# Altium footprint library bs_libs.PcbLib: 95 footprints (part 6 of 6)
Each footprint in its own frame and in the unit in brackets; x right, y up, seen from the top. Pads: shape width x height; smd on the part's side, far side on the other; paste and mask are expansions set on the pad; w line width, h text height; cw(c..) or ccw(c..) is an arc to the next point about the centre after c.
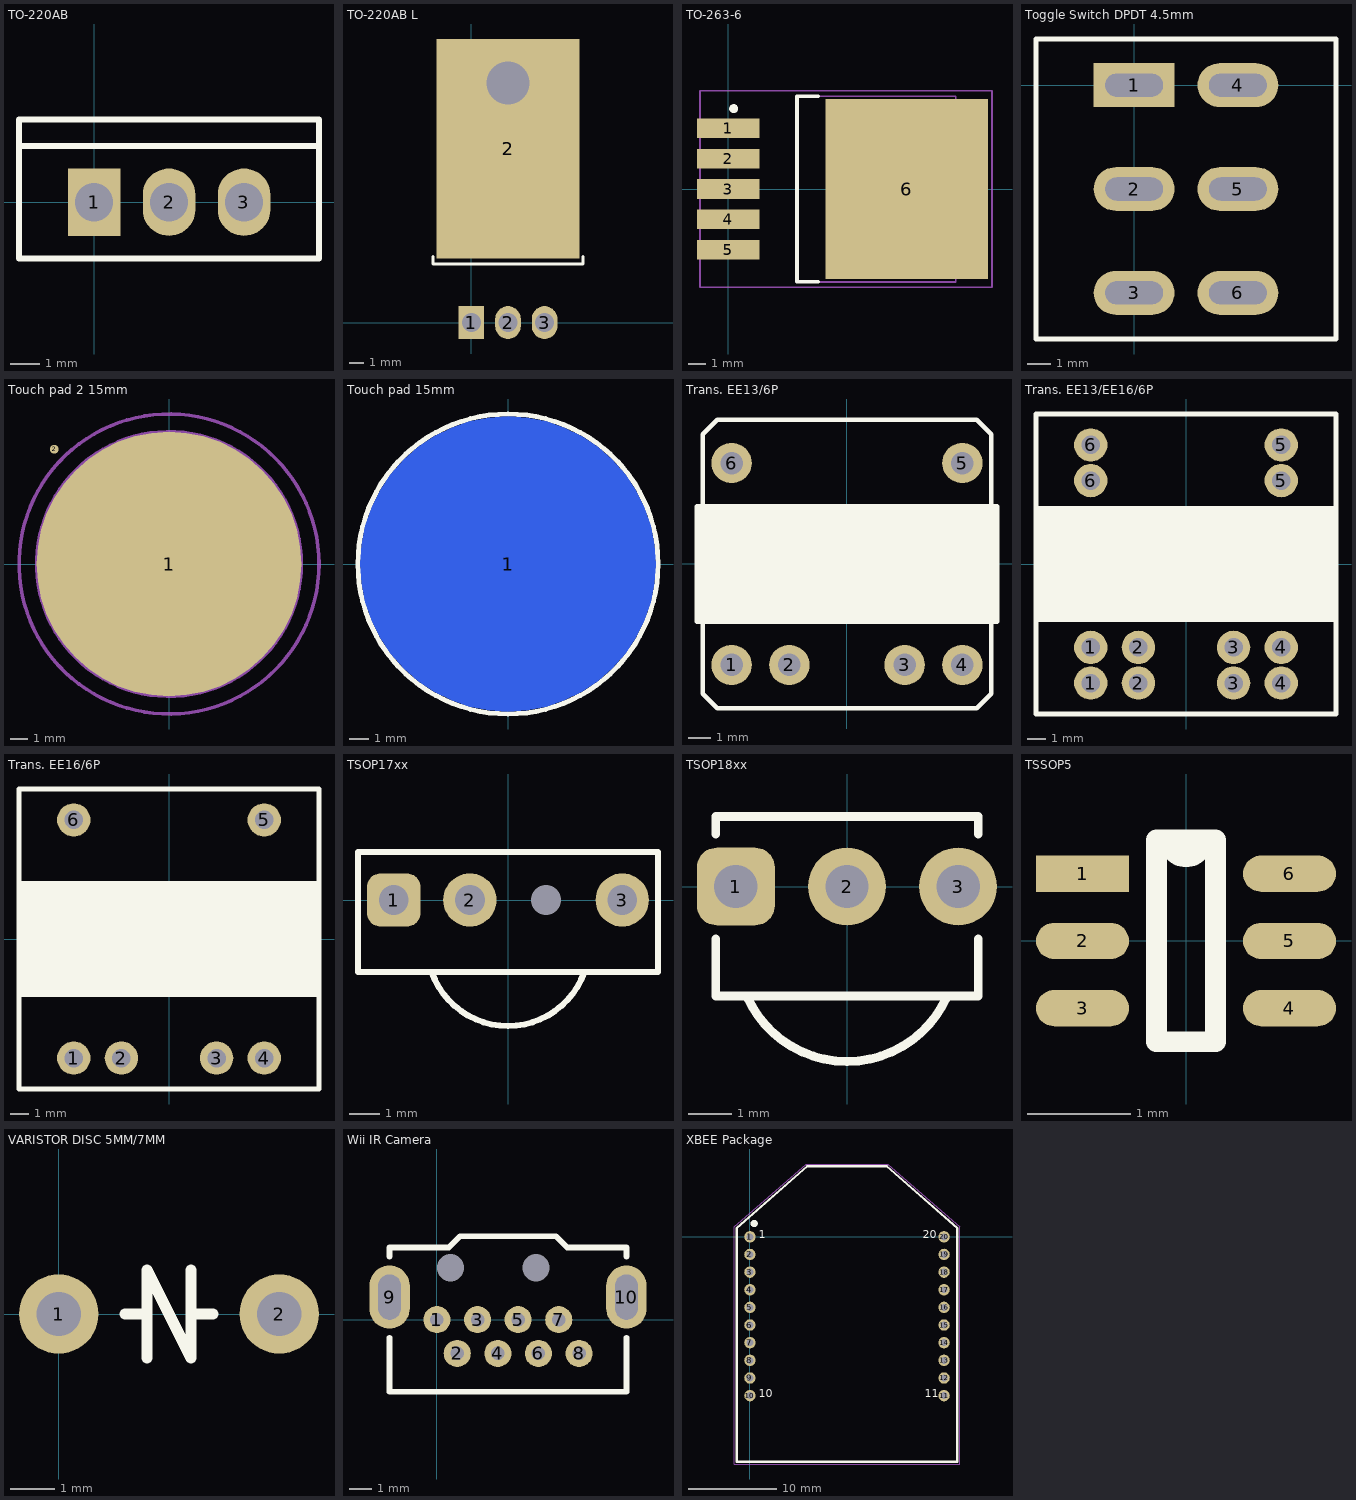
[diagram p5: the footprints below, top view; thin cyan lines are the x and y axes]

## TO-220AB [mil]
pads (3):
  rect 70x90 hole 51.18: 1(0,0)
  oval 70x90 hole 51.18: 2(100,0) 3(200,0)
Top Overlay:
  lines w8: -100,75 300,75 ; -100,-75 -100,110 300,110 300,-75 -100,-75
3D body "User Library-TO-220-4.STEP": height 767.41, standoff -366.45, extent -100.79,-70 300.79,107.16

## TO-220AB L [mil]
pads (5):
  rect 70x90 hole 51.18: 1(0,0)
  oval 70x90 hole 51.18: 2(100,0) 3(200,0)
  rect 390x600 smd: 2(100,475)
  round 0 hole 118.11: 2(100,655)
Top Overlay:
  lines w8: -105,180 -105,160 305,160 305,180
3D body "User Library-TO-220AB-L.step": height 177.17, standoff -118.11, extent -96.85,-10 296.85,765.76

## TO-263-6 [mm] "D2-PAK, 6-Pads, Body 8.9x10.4mm (max), IPC Medium Density"
height 4.65
pads (6):
  rect 3.5x1.1 smd: 1(0,3.4) 2(0,1.7) 3(0,0) 4(0,-1.7) 5(0,-3.4)
  rect 9.1x10.1 smd: 6(10,0)
Top Overlay:
  circle w0.25: c0.3,4.5 r0.125
  lines w0.2: 5.05,-5.2 3.85,-5.2 3.85,5.2 5.05,5.2
Mechanical 13:
  lines w0.1: 3.85,-5.2 12.74,-5.2 12.74,5.2 3.85,5.2 3.85,-5.2
Mechanical 15:
  lines w0.1: 6.1,0 7.1,0 ; 6.6,-0.5 6.6,0.5 ; -1.575,-5.5 14.775,-5.5 14.775,5.5 -1.575,5.5 -1.575,-5.5
3D body "SW3dPS-TO263-5.STEP": height 4.83, standoff 0.03, extent -0.956,-4.978 14.714,5.022

## Toggle Switch DPDT 4.5mm [mm]
pads (6):
  rect 3.5x1.9 hole 1 slot 2.5 at 0 deg: 1(0,0)
  oval 3.5x1.9 hole 1 slot 2.5 at 0 deg: 2(0,-4.5) 3(0,-9) 4(4.5,0) 5(4.5,-4.5) 6(4.5,-9)
Top Overlay:
  lines w0.2: -4.25,-11 -4.25,2 8.75,2 8.75,-11 -4.25,-11
3D body "User Library-toggle_sw.step": height 39.6, standoff -6.5, extent -3.568,-10.835 8.092,1.825

## Touch pad 2 15mm [mm]
pads (2):
  round 15 smd: 1(0,0)
  round 0.5 smd: 2(-6.5,6.5)
Mechanical 31:
  circle w0.203: c0,0 r8.5
  circle w0.203: c0,0 r7.5

## Touch pad 15mm [mm]
pads (1):
  round 15 smd far side: 1(0,0)
Top Overlay:
  circle w0.152: c0,0 r6.99
  circle w0.254: c0,0 r7.62

## Trans. EE13/6P [mil] "Tranformer EE13 6PIN"
pads (6):
  round 70 hole 39: 1(-200,-175) 2(-100,-175) 3(100,-175) 4(200,-175) 5(200,175) 6(-200,175)
Top Overlay:
  rectangle: -260,-100 260,100
  lines w8: -260,-100 260,-100 260,100 -260,100 -260,-100 ; -250,-225 -250,225 -225,250 225,250 250,225 250,-225 225,-250 -225,-250 -250,-225
3D body: height 450, standoff 400, extent -225,-225 225,225
3D body: height 400, standoff 100, extent -200,-200 200,200
3D body: height 500, standoff 0, extent -260,-100 260,100
3D body: height 100, standoff 0, extent -250,-250 250,250
3D body: height 0, standoff -100, extent -213.88,161.03 -186,188.98
3D body: height 0, standoff -100, extent 186.12,161.04 214.01,188.98
3D body: height 0, standoff -100, extent -213.88,-188.96 -185.99,-161.02
3D body: height 0, standoff -100, extent -113.88,-188.96 -85.99,-161.02
3D body: height 0, standoff -100, extent 86.12,-188.96 114.01,-161.02
3D body: height 0, standoff -100, extent 186.12,-188.96 214.01,-161.02

## Trans. EE13/EE16/6P [mil] "Tranformer EE16 6PIN"
pads (12):
  round 70 hole 39: 1(-200,-250) 1(-200,-175) 2(-100,-250) 2(-100,-175) 3(100,-250) 3(100,-175) 4(200,-250) 4(200,-175) 5(200,175) 5(200,250) 6(-200,175) 6(-200,250)
Top Overlay:
  rectangle: -314.96,-118.11 314.96,118.11
  lines w8: -314.96,-118.11 314.96,-118.11 314.96,118.11 -314.96,118.11 -314.96,-118.11
  lines w10: -314.96,-314.96 314.96,-314.96 314.96,314.96 -314.96,314.96 -314.96,-314.96
3D body: height 450, standoff 400, extent -225,-225 225,225
3D body: height 400, standoff 100, extent -200,-200 200,200
3D body: height 500, standoff 0, extent -260,-100 260,100
3D body: height 100, standoff 0, extent -250,-250 250,250
3D body: height 0, standoff -100, extent 186.12,161.04 214.01,188.98
3D body: height 0, standoff -100, extent -213.88,161.04 -185.99,188.98
3D body: height 0, standoff -100, extent -213.88,-188.96 -185.99,-161.02
3D body: height 0, standoff -100, extent 186.12,-188.96 214.01,-161.02
3D body: height 0, standoff -100, extent 86.12,-188.96 114.01,-161.02
3D body: height 0, standoff -100, extent -113.88,-188.96 -86,-161.02

## Trans. EE16/6P [mil] "Tranformer EE16 6PIN"
pads (6):
  round 70 hole 39: 1(-200,-250) 2(-100,-250) 3(100,-250) 4(200,-250) 5(200,250) 6(-200,250)
Top Overlay:
  rectangle: -314.96,-118.11 314.96,118.11
  lines w8: -314.96,-118.11 -314.96,118.11 314.96,118.11 314.96,-118.11 -314.96,-118.11
  lines w10: -314.96,-314.96 -314.96,314.96 314.96,314.96 314.96,-314.96 -314.96,-314.96
3D body: height 0, standoff -100, extent -213.88,-263.96 -185.99,-236.02
3D body: height 0, standoff -100, extent 186.12,236.04 214.01,263.98
3D body: height 0, standoff -100, extent -213.88,236.04 -185.99,263.98
3D body: height 0, standoff -100, extent 186.12,-263.96 214.01,-236.02
3D body: height 0, standoff -100, extent 86.12,-263.96 114.01,-236.02
3D body: height 0, standoff -100, extent -113.88,-263.96 -86,-236.02
3D body: height 100, standoff 0, extent -250,-250 250,250
3D body: height 500, standoff 0, extent -260,-100 260,100
3D body: height 400, standoff 100, extent -200,-200 200,200
3D body: height 450, standoff 400, extent -225,-225 225,225

## TSOP17xx [mil] "TSOP17xx IR receiver"
pads (4):
  rrect50% 70x70 hole 39: 1(-150,0)
  round 70 hole 39: 2(-50,0) 3(150,0)
  round 0 hole 39: NC(50,0)
Top Overlay:
  lines w8: -100.02,-95.06 ccw(c0,-59.06) 100.02,-95.06 ; -196.85,-94.49 -196.85,62.99 196.85,62.99 196.85,-94.49 -196.85,-94.49
3D body "User Library-tsop1738.step": height 512.13, standoff -692.6, extent -196.85,-165.35 196.85,62.99

## TSOP18xx [mil] "TSOP18xx IR receiver"
pads (3):
  rrect50% 70x70 hole 39: 1(-100,0)
  round 70 hole 39: 2(0,0) 3(100,0)
Top Overlay:
  lines w8: -118.11,-47.24 -118.11,-98.43 118.11,-98.43 118.11,-47.24 ; -118.11,47.24 -118.11,62.99 118.11,62.99 118.11,47.24 ; -90.26,-98.3 ccw(c0,-59.06) 90.26,-98.3
3D body "User Library-TSOP44xx-Right-IR reciver.step": height 326.81, standoff -189.15, extent -118.1,-155.35 118.12,151.17

## TSSOP5 [mm]
pads (6):
  rect 0.9x0.35 smd: 1(-1,0.65)
  oval 0.9x0.35 smd: 2(-1,0) 3(-1,-0.65) 4(1,-0.65) 5(1,0) 6(1,0.65)
Top Overlay:
  lines w0.2: -0.285,-0.975 -0.285,0.975 0.162,0.975 cw(c0,0.975) -0.162,0.975 0.285,0.975 0.285,-0.975 -0.285,-0.975
3D body "User Library-TSSOP-5 (SOT-23-5 PITCH 0_65).STEP": height 1.1, standoff -0.01, extent -1.125,-1.125 1.125,1.125

## VARISTOR DISC 5MM/7MM [mm] "VARISTOR 23V 250A DISC 7MM"
pads (2):
  round 1.8 hole 1: 1(0,0) 2(5,0)
Top Overlay:
  lines w0.254: 1.5,0 2,0 ; 2,-1 2,1 3,-1 3,1 ; 3,0 3.5,0
3D body "User Library-Warystor_5mm.step": height 11, standoff -1.57, extent -1.5,-1.26 6.5,1.25

## Wii IR Camera [mm]
pads (12):
  round 1.2 hole 0.6: 1(0,0) 2(0.9,-1.5) 3(1.8,0) 4(2.7,-1.5) 5(3.6,0) 6(4.5,-1.5) 7(5.4,0) 8(6.3,-1.5)
  oval 1.8x2.8 hole 1 slot 2 at 90 deg: 9(-2.1,1) 10(8.4,1)
  round 0 hole 1.2: H1(0.6,2.3) H2(4.4,2.3)
Top Overlay:
  lines w0.254: -2.1,-0.8 -2.1,-3.2 8.4,-3.2 8.4,-0.8 ; -2.1,2.8 -2.1,3.2 0.525,3.2 1.025,3.7 5.275,3.7 5.775,3.2 8.4,3.2 8.4,2.8

## XBEE Package [mil]
pads (20):
  round 51 hole 31: 1(0,0) 2(0,-78.74) 3(0,-157.48) 4(0,-236.22) 5(0,-314.96) 6(0,-393.7) 7(0,-472.44) 8(0,-551.18) 9(0,-629.92) 10(0,-708.66) 11(866.14,-708.66) 12(866.14,-629.92) 13(866.14,-551.18) 14(866.14,-472.44) 15(866.14,-393.7) 16(866.14,-314.96) 17(866.14,-236.22) 18(866.14,-157.48) 19(866.14,-78.74) 20(866.14,0)
Top Overlay:
  circle w15: c18.76,59.06 r8.8
  lines w10: -59.06,-1003.94 925.2,-1003.94 925.2,39.37 610.24,314.96 255.91,314.96 -59.06,39.37 -59.06,-1003.94
  text "20" at 771.65,-19.68 h60
  text "11" at 779.53,-728.35 h60
  text "10" at 39.37,-728.35 h60
  text "1" at 39.37,-19.68 h60
Mechanical 1:
  lines w2: -68.9,-1013.78 935.04,-1013.78 935.04,44.05 614.17,324.8 251.97,324.8 -68.9,44.05 -68.9,-1013.78